# Altium footprint library PcbLib1.PcbLib: 170 footprints (part 6 of 11)
Each footprint in its own frame and in the unit in brackets; x right, y up, seen from the top. Pads: shape width x height; smd on the part's side, far side on the other; paste and mask are expansions set on the pad; w line width, h text height; cw(c..) or ccw(c..) is an arc to the next point about the centre after c.
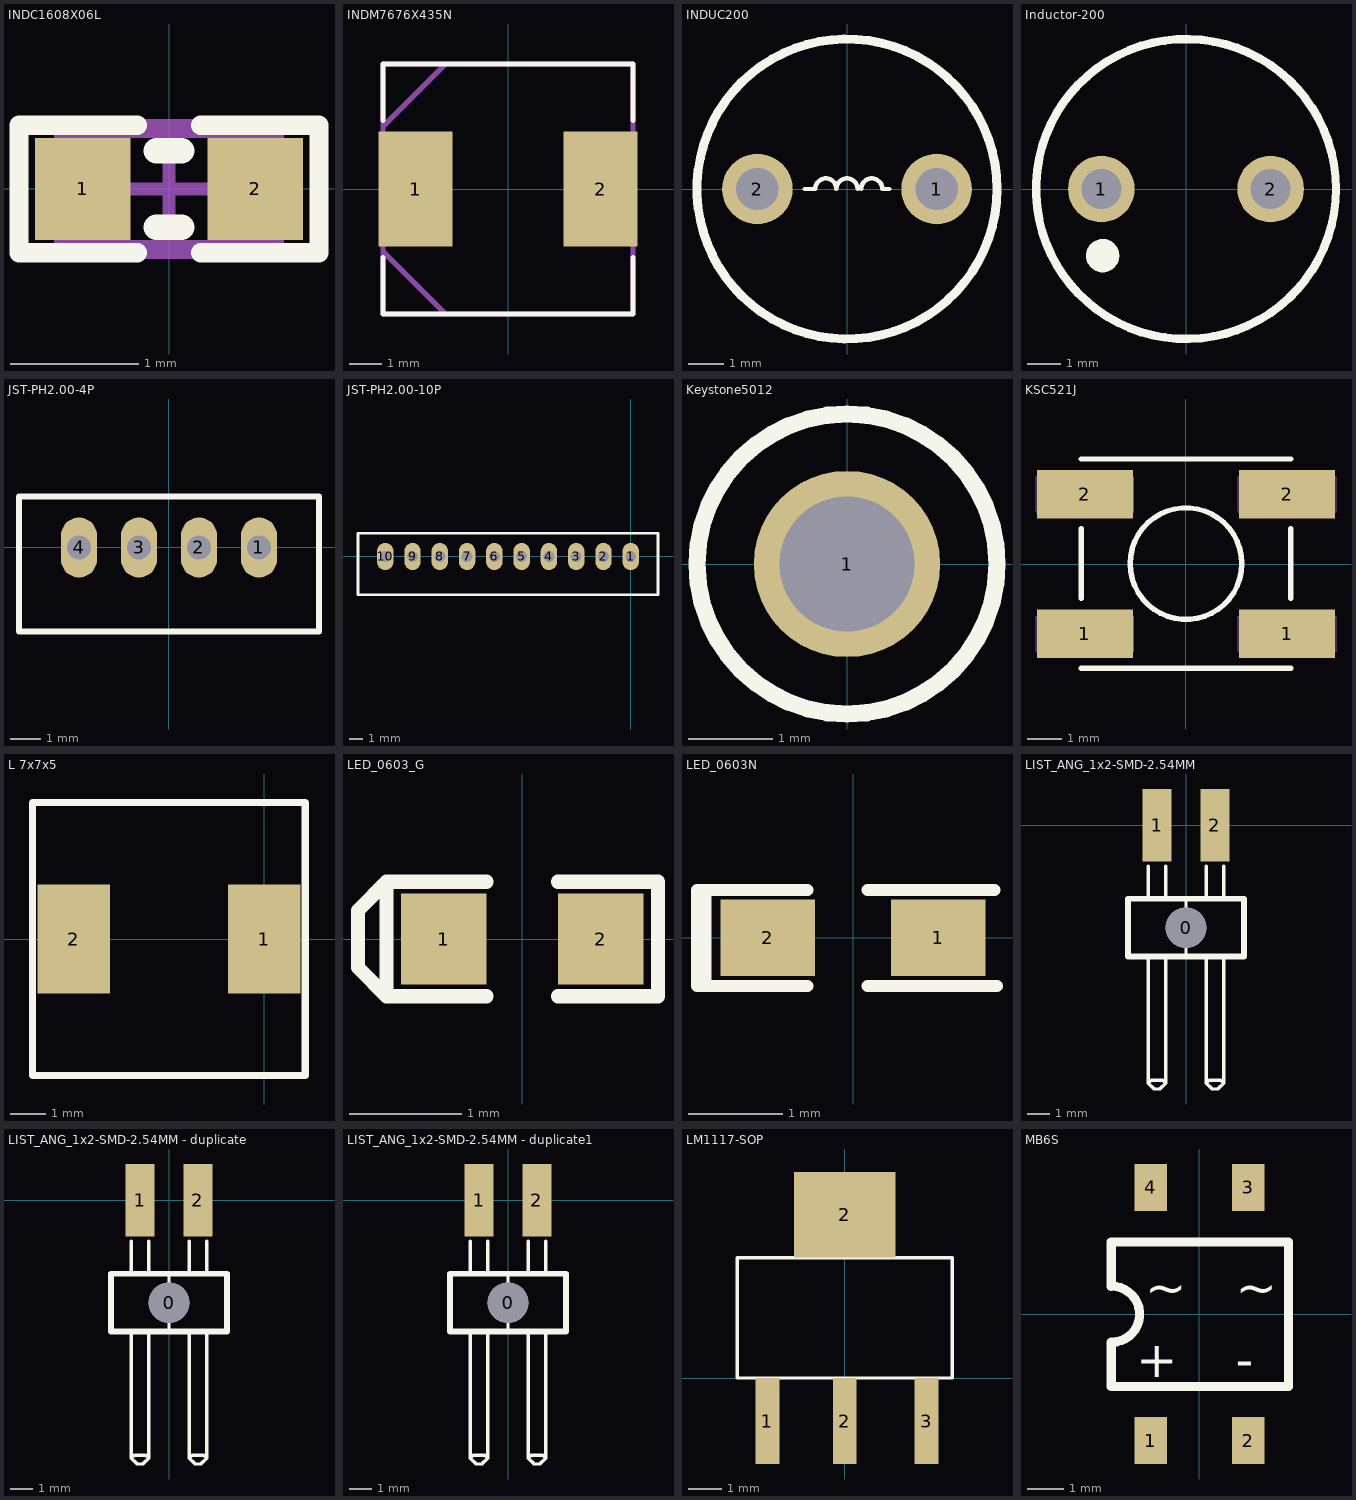
[diagram p5: the footprints below, top view; thin cyan lines are the x and y axes]

## INDC1608X06L [mm] "Chip Inductor, 2-Leads, Body 1.6x0.8mm, IPC High Density"
height 0.55
pads (2):
  rect 0.75x0.8 smd: 1(-0.675,0) 2(0.675,0)
Top Overlay:
  lines w0.152: -0.25,-0.5 -1.175,-0.5 -1.175,0.5 -0.25,0.5 ; 0.25,-0.5 1.175,-0.5 1.175,0.5 0.25,0.5
  lines w0.2: -0.1,-0.3 0.1,-0.3 ; -0.1,0.3 0.1,0.3
Mechanical 13:
  lines w0.1: -0.85,-0.45 -0.85,0.45 0.85,0.45 0.85,-0.45 -0.85,-0.45
Mechanical 15:
  lines w0.1: -0.45,0 0.45,0 ; 0,-0.45 0,0.45 ; -1.175,-0.5 1.175,-0.5 1.175,0.5 -1.175,0.5 -1.175,-0.5
3D body: height 0.8, standoff 0, extent -0.8,-0.475 0.8,0.475

## INDM7676X435N [mil]
height 55.12
pads (2):
  rect 89x138 smd: 1(-111,0) 2(111,0)
Top Overlay:
  lines w6: -150,-82 -150,-150 150,-150 150,-82 ; -150,82 -150,150 150,150 150,82
Mechanical 1:
  lines w6: -150,-75 -75,-150 ; -150,75 -75,150 ; -150,-150 150,-150 150,150 -150,150 -150,-150
3D body: height 118.59, standoff -21.17, extent -148.61,-148.21 150.61,151

## INDUC200 [mm]
pads (2):
  round 2 hole 1.2: 1(2.54,0) 2(-2.54,0)
Top Overlay:
  circle w0.254: c0,0 r4.25
  lines w0.127: -1.2,0 -0.9,0 cw(c-0.6,0) -0.3,0 cw(c0,0) 0.3,0 ; 0.4,0 cw(c0.7,0) 1,0 1.2,0

## Inductor-200 [mm]
pads (2):
  round 2 hole 1.2: 1(-2.54,0) 2(2.54,0)
Top Overlay:
  circle w0.254: c0,0 r4.5
  circle w0.5: c-2.5,-2 r0.25

## JST-PH2.00-4P [mm]
height 3.05
pads (4):
  oval 1.2x2 hole 0.8 paste+0: 1(3,0) 2(1,0) 3(-1,0) 4(-3,0)
Top Overlay:
  lines w0.2: 5,0 5,1.7 ; 5,1.7 -5,1.7 -5,-2.8 5,-2.8 5,1.7
3D body: height 5.89, standoff -3.05, extent -4.93,-2.974 4.93,1.7

## JST-PH2.00-10P [mm]
height 3.05
pads (10):
  oval 1.2x2 hole 0.8 paste+0: 1(0,0) 2(-2,0) 3(-4,0) 4(-6,0) 5(-8,0) 6(-10,0) 7(-12,0) 8(-14,0) 9(-16,0) 10(-18,0)
Top Overlay:
  lines w0.2: 2,0 2,1.7 ; 2,1.7 2,-2.8 -20,-2.8 -20,1.7 2,1.7
3D body: height 5.89, standoff -3.05, extent -19.93,-2.874 1.93,1.8

## Keystone5012 [mil] "Keystone Multipurpose loops"
height 320
pads (1):
  round 87 hole 63: 1(0,0)
Top Overlay:
  circle w7.99: c0,0 r70
Mechanical 5:
  circle w5: c0,0 r69.46
3D body: height 318.9, standoff -125.98, extent -63,-63 62.74,62.49

## KSC521J [mm] "6.2×6.2mm TACT Switch, without ground connector"
height 2.5
pads (4):
  rect 2.75x1.4 smd: 1(-2.9,-2) 1(2.901,-2) 2(-2.9,2) 2(2.901,2)
Top Overlay:
  circle w0.152: c0,0.011 r1.601
  lines w0.152: -3,-2.989 3,-2.989 ; -3,-0.989 -3,1.011 ; -3,3.011 3,3.011 ; 3,-0.989 3,1.011
Mechanical 1:
  lines w0.013: -4.299,-2.5 -4.299,-1.5 -1.499,-1.5 -1.499,-2.5 -4.299,-2.5 ; -4.299,1.5 -1.499,1.5 -1.499,2.5 -4.299,2.5 -4.299,1.5 ; 1.501,-2.5 4.301,-2.5 4.301,-1.5 1.501,-1.5 1.501,-2.5 ; 1.501,1.5 4.301,1.5 4.301,2.5 1.501,2.5 1.501,1.5
3D body: height 3.1, standoff 0, extent -4,-2.989 4,3.311

## L 7x7x5 [mm]
height 4
pads (2):
  rect 2.03x3.05 smd: 1(0,0) 2(-5.33,0)
Top Overlay:
  lines w0.2: -6.477,-3.81 -6.477,3.81 1.143,3.81 1.143,-3.81 -6.477,-3.81

## LED_0603_G [mil] "SMD Super Bright LED, GREEN"
height 23.62
pads (2):
  rect 30x32 smd: 1(-27.5,0) 2(27.5,0)
Top Overlay:
  lines w5: -12.5,-20 -47.5,-20 ; -12.5,20 -47.5,20 ; 12.5,-20 47.5,-20 47.5,20 12.5,20 ; -47.5,-20 -57.5,-10 -57.5,10 -47.5,20 ; -47.5,-20 -47.5,20
3D body: height 23.62, standoff 0, extent -31.63,-15.75 32.15,15.75

## LED_0603N [mm] "SMD Super Bright LED, GREEN"
height 0.6
pads (2):
  rect 1x0.813 smd: 1(0.9,0) 2(-0.9,0)
Top Overlay:
  rectangle: -1.651,-0.533 -1.499,0.508
  lines w0.127: -0.483,-0.508 -1.372,-0.508 -1.651,-0.508 -1.651,0.508 -1.372,0.508 -0.483,0.508 ; 0.152,-0.508 1.041,-0.508 ; 0.152,0.508 1.041,0.508 1.499,0.508 ; 0.965,-0.508 1.524,-0.508
3D body: height 0.3, standoff -0.3, extent -0.78,-0.314 0.822,0.887

## LIST_ANG_1x2-SMD-2.54MM [mm] "Pin List, 2.54mm, Surface Mount, Angled"
height 3.05
pads (3):
  round 1.78 hole 1.78: 0(0,-4.496)
  rect 1.27x3.18 smd: 1(-1.27,0) 2(1.27,0)
Top Overlay:
  lines w0.15: -1.651,-5.766 -1.651,-11.324 ; -1.651,-3.226 -1.651,-1.8 ; -0.889,-5.766 -0.889,-11.324 ; -0.889,-3.226 -0.889,-1.8 ; 0,-5.766 0,-3.226 ; 0.889,-5.766 0.889,-11.324 ; 0.889,-3.226 0.889,-1.8 ; 1.651,-5.766 1.651,-11.324 ; 1.651,-3.226 1.651,-1.8 ; -1.651,-11.324 -1.397,-11.578 -1.143,-11.578 -0.889,-11.324 ; -1.651,-11.324 -1.524,-11.197 -1.016,-11.197 -0.889,-11.324 ; 0.889,-11.324 1.143,-11.578 1.397,-11.578 1.651,-11.324 ; 0.889,-11.324 1.016,-11.197 1.524,-11.197 1.651,-11.324
  lines w0.254: -2.54,-5.766 -2.54,-3.226 2.54,-3.226 2.54,-5.766 -2.54,-5.766
3D body: height 3.03, standoff -1.41, extent -2.56,-11.605 2.52,1.349

## LIST_ANG_1x2-SMD-2.54MM - duplicate [mm] "Pin List, 2.54mm, Surface Mount, Angled"
height 3.05
pads (3):
  round 1.78 hole 1.78: 0(0,-4.496)
  rect 1.27x3.18 smd: 1(-1.27,0) 2(1.27,0)
Top Overlay:
  lines w0.15: -1.651,-5.766 -1.651,-11.324 ; -1.651,-3.226 -1.651,-1.8 ; -0.889,-5.766 -0.889,-11.324 ; -0.889,-3.226 -0.889,-1.8 ; 0,-5.766 0,-3.226 ; 0.889,-5.766 0.889,-11.324 ; 0.889,-3.226 0.889,-1.8 ; 1.651,-5.766 1.651,-11.324 ; 1.651,-3.226 1.651,-1.8 ; -1.651,-11.324 -1.524,-11.197 -1.016,-11.197 -0.889,-11.324 ; -1.651,-11.324 -1.397,-11.578 -1.143,-11.578 -0.889,-11.324 ; 0.889,-11.324 1.016,-11.197 1.524,-11.197 1.651,-11.324 ; 0.889,-11.324 1.143,-11.578 1.397,-11.578 1.651,-11.324
  lines w0.254: -2.54,-5.766 2.54,-5.766 2.54,-3.226 -2.54,-3.226 -2.54,-5.766
3D body: height 3.03, standoff -1.41, extent -2.56,-11.605 2.52,1.349

## LIST_ANG_1x2-SMD-2.54MM - duplicate1 [mm] "Pin List, 2.54mm, Surface Mount, Angled"
height 3.05
pads (3):
  round 1.78 hole 1.78: 0(0,-4.496)
  rect 1.27x3.18 smd: 1(-1.27,0) 2(1.27,0)
Top Overlay:
  lines w0.15: -1.651,-5.766 -1.651,-11.324 ; -1.651,-3.226 -1.651,-1.8 ; -0.889,-5.766 -0.889,-11.324 ; -0.889,-3.226 -0.889,-1.8 ; 0,-5.766 0,-3.226 ; 0.889,-5.766 0.889,-11.324 ; 0.889,-3.226 0.889,-1.8 ; 1.651,-5.766 1.651,-11.324 ; 1.651,-3.226 1.651,-1.8 ; -1.651,-11.324 -1.524,-11.197 -1.016,-11.197 -0.889,-11.324 ; -1.651,-11.324 -1.397,-11.578 -1.143,-11.578 -0.889,-11.324 ; 0.889,-11.324 1.016,-11.197 1.524,-11.197 1.651,-11.324 ; 0.889,-11.324 1.143,-11.578 1.397,-11.578 1.651,-11.324
  lines w0.254: -2.54,-5.766 2.54,-5.766 2.54,-3.226 -2.54,-3.226 -2.54,-5.766
3D body: height 3.03, standoff -1.41, extent -2.56,-11.605 2.52,1.349

## LM1117-SOP [mm]
pads (4):
  rect 0.7x2.54 smd: 1(-2.286,-1.27) 2(0,-1.27) 3(2.413,-1.27)
  rect 3x2.54 smd: 2(0,4.826)
Top Overlay:
  lines w0.1: -3.175,0 3.175,0 3.175,3.556 -3.175,3.556 -3.175,0

## MB6S [mm]
pads (4):
  rect 0.9x1.3 smd: 1(-1.35,-3.5) 2(1.35,-3.5) 3(1.35,3.5) 4(-1.35,3.5)
Top Overlay:
  lines w0.254: -2.44,-2.01 -2.44,-0.78 ; -2.44,-2.01 2.46,-2.01 2.46,1.99 -2.44,1.99 -2.44,0.76 ; -2.44,0.77 cw(c-2.43,-0.005) -2.42,-0.78
  text "~" at 1,0.25 h1
  text "~" at -1.5,0.25 h1
  text "-" at 1,-1.75 h1
  text "+" at -1.75,-1.75 h1